# Altium footprint library Selex_PCBLib.PcbLib: 388 footprints (part 3 of 25)
Each footprint in its own frame and in the unit in brackets; x right, y up, seen from the top. Pads: shape width x height; smd on the part's side, far side on the other; paste and mask are expansions set on the pad; w line width, h text height; cw(c..) or ccw(c..) is an arc to the next point about the centre after c.
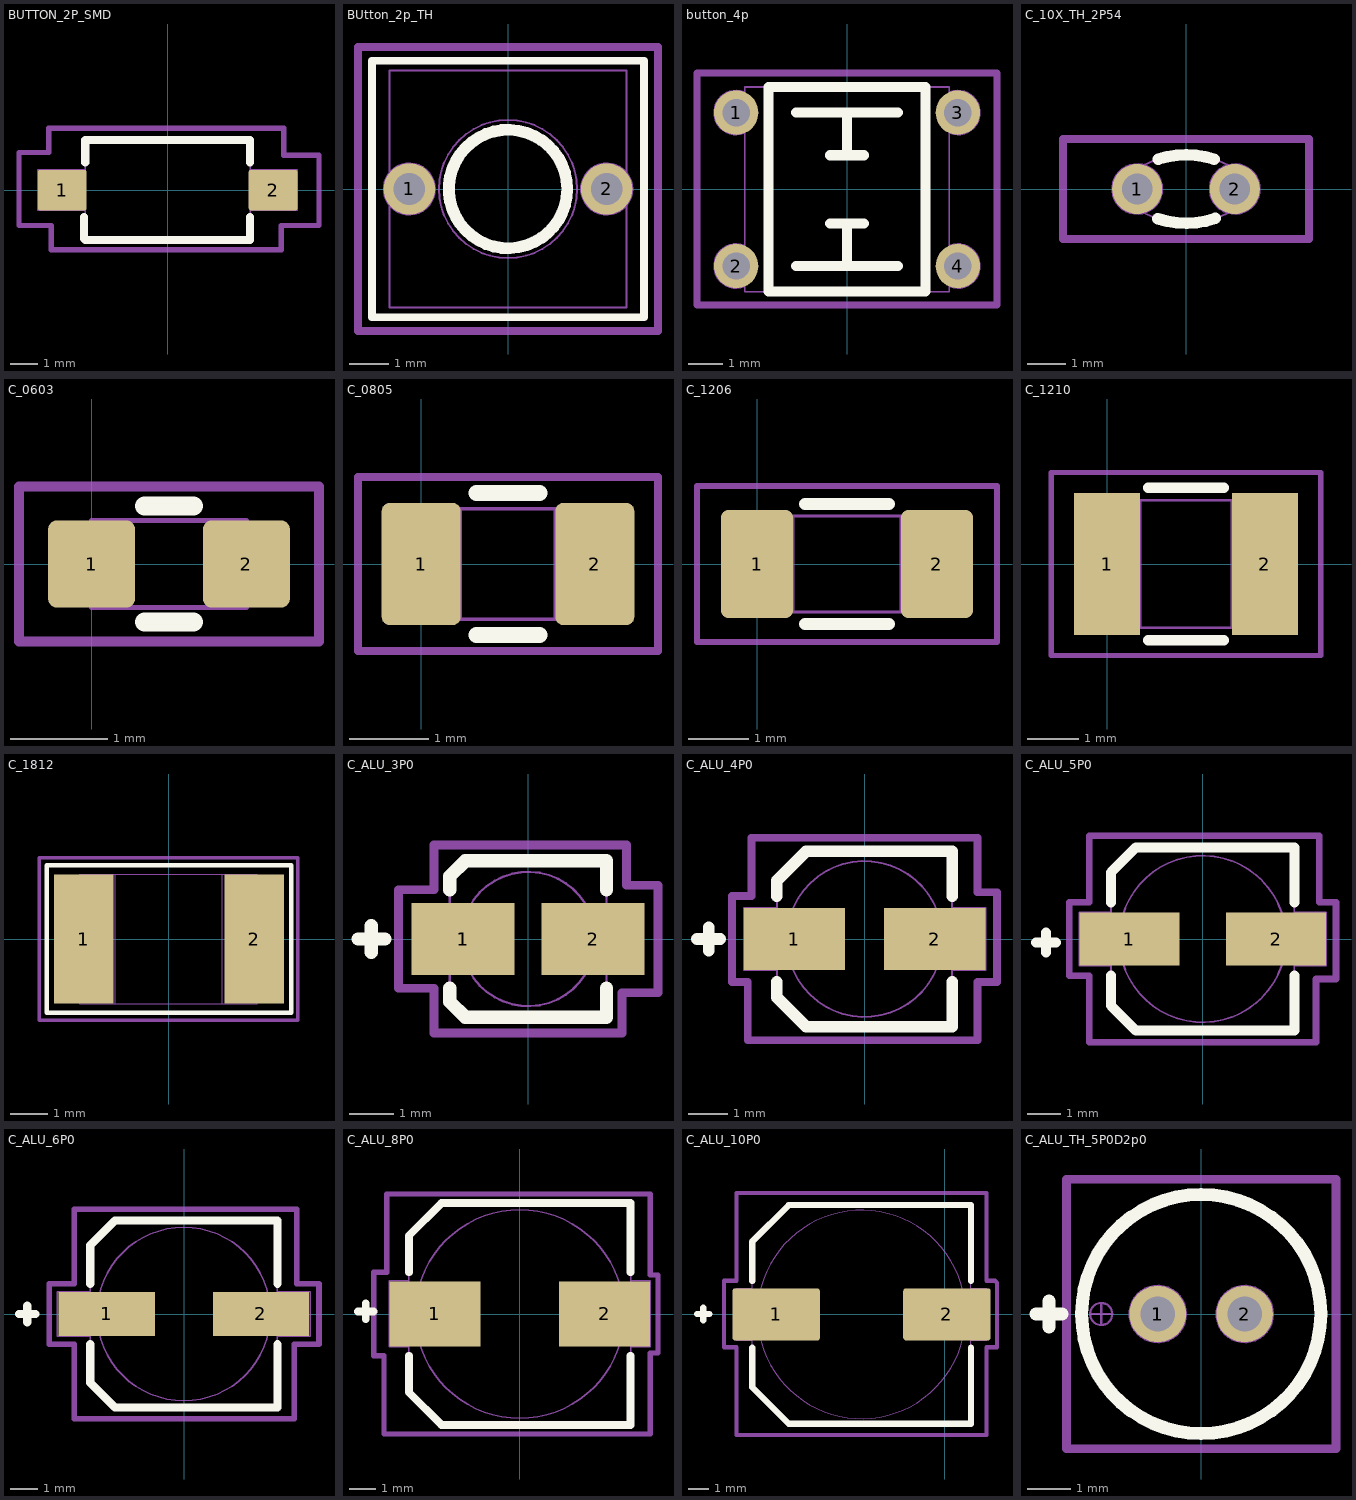
[diagram p2: the footprints below, top view; thin cyan lines are the x and y axes]

## BUTTON_2P_SMD [mm]
pads (2):
  rrect10% 1.8x1.5 smd mask+0.05: 1(-3.9,0.01) 2(3.9,0.01)
Top Overlay:
  lines w0.3: -3.1,-1.79 -3.1,-0.99 ; -3.05,-1.84 3.05,-1.84 3.05,-0.99 ; -3.05,1.035 -3.05,1.86 ; 2.2,1.86 -3.05,1.86 ; 3.05,1.035 3.05,1.86 -3.05,1.86
Mechanical 1:
  lines w0.05: -3.05,-0.74 -4.8,-0.74 -4.8,0.76 -3.05,0.76 ; 3.05,-0.74 4.8,-0.74 4.8,0.76 3.05,0.76 ; -3.05,-1.84 3.05,-1.84 3.05,1.86 -3.05,1.86 -3.05,-1.84
Mechanical 15:
  lines w0.2: -5.5,-1.3 -4.3,-1.3 -4.3,-2.2 4.2,-2.2 4.2,-1.3 5.6,-1.3 5.6,1.3 4.3,1.3 4.3,2.3 -4.4,2.3 -4.4,1.4 -5.5,1.4 -5.5,-1.3
3D body "User Library-KFC-2Pin SMD.step": height 4.2, standoff 0, extent -4.075,-1.665 3.925,1.835

## BUtton_2p_TH [mm]
pads (2):
  round 1.3 hole 0.8 mask+0.1: 1(-2.5,0) 2(2.5,0)
Top Overlay:
  circle w0.3: c0,0 r1.5
  lines w0.2: -3.45,-3.25 -3.45,3.25 3.45,3.25 3.45,-3.25 -3.45,-3.25
Mechanical 1:
  circle w0.05: c0,0 r1.75
  circle w0.05: c2.5,0 r0.65
  circle w0.05: c-2.5,0 r0.65
  lines w0.05: -3,-0.41 -3,-3 3,-3 3,-0.42 ; -3,0.41 -3,3 3,3 3,0.42
Mechanical 15:
  lines w0.2: -3.8,-3.6 3.8,-3.6 3.8,3.6 -1.2,3.6 -3.8,3.6 -3.8,-3.6
3D body "button2pin.step": height 4.2, standoff -4, extent -3,-3 3,3

## button_4p [mm]
pads (4):
  round 1.3 hole 0.8 mask+0.05: 1(-3.25,2.24) 2(-3.25,-2.26) 3(3.25,2.24) 4(3.25,-2.26)
Top Overlay:
  lines w0.3: -1.5,-2.26 1.5,-2.26 ; -1.5,2.24 1.5,2.24 ; -0.5,-1.01 0.5,-1.01 ; -0.5,0.99 0.5,0.99 ; 0,-2.26 0,-1.01 ; 0,0.99 0,2.24 ; -2.3,-3.01 2.3,-3.01 2.3,2.99 -2.3,2.99 -2.3,-3.01
Mechanical 1:
  lines w0.05: -3.017,-2.867 cw(c-3.25,-2.26) -3.017,-1.653 ; -3.017,1.633 cw(c-3.25,2.24) -3.017,2.847 ; 3.017,-2.867 ccw(c3.25,-2.26) 3.017,-1.653 ; 3.017,1.633 ccw(c3.25,2.24) 3.017,2.847 ; -3,-3.01 3,-3.01 3,2.99 -3,2.99 -3,-3.01
Mechanical 15:
  lines w0.2: -4.4,-3.4 4.4,-3.4 4.4,-0.8 4.4,3.4 -4.4,3.4 -4.4,-3.4
3D body "buttona.stp": height 5, standoff -3.5, extent -3.95,-3.11 3.95,3.09

## C_10X_TH_2P54 [mm] "Cap 10x"
pads (2):
  round 1.3 hole 0.8: 1(-1.27,0) 2(1.27,0)
Top Overlay:
  lines w0.2: -0.053,-0.89 0.041,-0.89 ; -0.041,0.89 0.053,0.89
  lines w0.3: -0.732,-0.776 ccw(c0,1.507) 0.759,-0.767 ; -0.723,0.779 cw(c0,-1.507) 0.729,0.777
Mechanical 1:
  circle w0.05: c1.27,0 r0.65
  circle w0.05: c-1.27,0 r0.65
  lines w0.05: -1.09,0.628 cw(c0,-1.507) 1.094,0.626 ; -1.086,-0.63 ccw(c0,1.507) 1.097,-0.625
Mechanical 15:
  lines w0.2: -3.2,-1.3 0,-1.3 3.2,-1.3 3.2,1.3 -3.2,1.3 -3.2,-1.3
3D body "Ceramic Cap 100n.STEP": height 6.42, standoff -1.5, extent -2.917,-0.848 2.921,0.848

## C_0603 [mm] "Capacitor 0603"
pads (2):
  rrect20% 0.9x0.9 smd mask+0.1: 1(0,0) 2(1.6,0)
Top Overlay:
  lines w0.2: 0.55,-0.6 1.05,-0.6 ; 0.55,0.6 1.05,0.6
Top Component Outline:
  lines w0.1: -0.75,-0.8 -0.75,0.8 2.35,0.8 2.35,-0.8 -0.75,-0.8
Top Assembly:
  lines w0.05: 0.4,-0.45 0.4,0.45 ; 1.2,-0.45 1.2,0.45 ; 0,-0.45 0,0.45 1.6,0.45 1.6,-0.45 0,-0.45
3D body "capacitor 0603.step": height 0.81, standoff 0.01, extent 0,-0.45 1.6,0.45

## C_0805 [mm] "Capacitor 0805"
pads (2):
  rrect20% 1x1.55 smd mask+0.1: 1(0,0) 2(2.2,0)
Top Overlay:
  lines w0.2: 0.7,-0.9 1.5,-0.9 ; 0.7,0.9 1.5,0.9
Mechanical 1:
  lines w0.05: 0.49,-0.7 0.49,0.7 ; 1.7,-0.7 1.7,0.675 ; 0,-0.7 2.2,-0.7 2.2,0.7 0,0.7 0,-0.7
Mechanical 15:
  lines w0.1: -0.8,-1.1 -0.8,1.1 3,1.1 3,-1.1 -0.8,-1.1
3D body "CAP0805.step": height 1.35, standoff 0, extent 0,-0.725 2.2,0.725

## C_1206 [mm] "Capacitor 1206"
pads (2):
  rrect20% 1.2x1.8 smd mask+0.1: 1(0,0) 2(3,0)
Top Overlay:
  lines w0.2: 0.8,-1 2.2,-1 ; 0.8,1 2.2,1
Mechanical 1:
  lines w0.05: 0.6,-0.8 0.6,0.8 ; 2.4,-0.8 2.4,0.8 ; -0.1,-0.8 3.1,-0.8 3.1,0.8 -0.1,0.8 -0.1,-0.8
Mechanical 15:
  lines w0.1: -1,-1.3 -1,1.3 4,1.3 4,-1.3 -1,-1.3
3D body "capacitor 1206.step": height 1, standoff 0, extent -0.1,-0.8 3.1,0.8

## C_1210 [mm] "Capacitor 1210"
pads (2):
  rect 1.3x2.8 smd mask+0.1: 1(0,0) 2(3.1,0)
Top Overlay:
  lines w0.2: 0.8,-1.5 2.3,-1.5 ; 0.8,1.5 2.3,1.5
Mechanical 1:
  lines w0.05: 0.65,-1.25 0.65,1.25 ; 2.45,-1.25 2.45,1.25 ; -0.05,-1.25 -0.05,1.25 3.15,1.25 3.15,-1.25 -0.05,-1.25
Mechanical 15:
  lines w0.1: -1.1,-1.8 4.2,-1.8 4.2,1.8 -1.1,1.8 -1.1,-1.8
3D body "CAP1210a.step": height 1.1, standoff 0, extent -0.09,-1.25 3.19,1.25

## C_1812 [mm]
pads (2):
  rect 1.606x3.5 smd: 1(-2.3,0) 2(2.325,0)
Top Overlay:
  lines w0.127: -3.3,-2 -3.3,2 -2.6,2 3.327,2 3.327,-2 1.8,-2 -3.3,-2
Mechanical 1:
  lines w0.025: -2.4,-1.75 -2.4,1.75 ; -2.4,-1.75 -1.45,-1.75 -1.45,1.75 -2.4,1.75 ; -2.4,-1.75 2.4,-1.75 ; -2.4,-1.75 -2.4,1.75 ; -2.4,1.75 2.4,1.75 ; 2.4,-1.75 1.45,-1.75 1.45,1.75 2.4,1.75 ; 2.4,-1.75 2.4,1.75 ; 2.4,-1.75 2.4,1.75
Mechanical 15:
  lines w0.1: -3.5,-2.2 -3.5,2.2 3.5,2.2 3.5,-2.2 -3.5,-2.2
3D body "CAPC480350_180N_KEM.step": height 1.8, standoff 0, extent -2.4,-1.75 2.4,1.75

## C_ALU_3P0 [mm] "Panasonic Aluminum Capacitor 3.0x5.4"
pads (3):
  rect 2.3x1.6 smd mask+0.1: 1(-1.45,0) 1(-1.45,0) 2(1.45,0)
Top Overlay:
  lines w0.3: -3.8,0 -3.2,0 ; -3.5,-0.3 -3.5,0.3 ; -1.75,-1.1 -1.75,-1.4 -1.4,-1.75 1.75,-1.75 1.75,-1.1 ; -1.75,1.1 -1.75,1.4 -1.4,1.75 1.75,1.75 1.75,1.1
Mechanical 1:
  circle w0.05: c0,0 r1.5
  lines w0.05: -1.75,-1.4 -1.75,1.4 -1.4,1.75 1.75,1.75 1.75,-1.75 -1.4,-1.75 -1.75,-1.4
Mechanical 15:
  lines w0.2: -2.9,-1.1 -2.9,1.1 -2.1,1.1 -2.1,2.1 2.2,2.1 2.2,1.2 2.9,1.2 2.9,-1.2 2.1,-1.2 2.1,-2.1 -2.1,-2.1 -2.1,-1.1 -2.9,-1.1

## C_ALU_4P0 [mm] "Panasonic Aluminum Capacitor 4.0 x5.4"
pads (2):
  rect 2.6x1.6 smd mask+0.1: 1(-1.8,0) 2(1.8,0)
Top Overlay:
  lines w0.3: -4.3,0 -3.7,0 ; -4,-0.3 -4,0.3 ; -2.25,-1.1 -2.25,-1.5 -1.5,-2.25 2.25,-2.25 2.25,-1.1 ; -2.25,1.1 -2.25,1.5 -1.5,2.25 2.25,2.25 2.25,1.1
Mechanical 1:
  circle w0.05: c0,0 r2
  lines w0.05: -2.25,-0.8 -3.1,-0.8 -3.1,0.8 -2.25,0.8 ; 2.25,-0.8 3.1,-0.8 3.1,0.8 2.25,0.8 ; -2.25,-1.5 -2.25,1.5 -1.5,2.25 2.25,2.25 2.25,-2.25 -1.5,-2.25 -2.25,-1.5
Mechanical 15:
  lines w0.2: -3.4,-1.1 -3,-1.1 -3,-2.6 2.9,-2.6 2.9,-1.1 3.4,-1.1 3.4,1.2 2.9,1.2 2.9,2.6 -2.9,2.6 -2.9,1.1 -3.4,1.1 -3.4,-1.1
3D body "CAPALUSIZEB.step": height 5.7, standoff 0, extent -2.65,-2.15 2.65,2.15

## C_ALU_5P0 [mm] "Panasonic Aluminum Capacitor 5x5.4"
pads (2):
  rect 3x1.6 smd mask+0.1: 1(-2.2,0) 2(2.2,0)
Top Overlay:
  lines w0.3: -5,-0.1 -4.4,-0.1 ; -4.7,-0.4 -4.7,0.2 ; -2.75,-1.1 -2.75,-2 -2,-2.75 2.75,-2.75 2.75,-1.1 ; -2.75,1.1 -2.75,2 -2,2.75 2.75,2.75 2.75,1.1
Mechanical 1:
  circle w0.05: c0,0 r2.5
  lines w0.05: -2.75,-0.8 -3.7,-0.8 -3.7,0.8 -2.75,0.8 ; 2.75,-0.8 3.7,-0.8 3.7,0.8 2.75,0.8 ; -2.75,-2 -2.75,2 -2,2.75 2.75,2.75 2.75,-2.75 -2,-2.75 -2.75,-2
Mechanical 15:
  lines w0.2: -4,-1.1 -4,1.1 -3.4,1.1 -3.4,3.1 -2,3.1 3.5,3.1 3.5,1.1 4,1.1 4,-1.2 3.4,-1.2 3.4,-3.1 -3.4,-3.1 -3.4,-1.1 -4,-1.1
3D body "CAPALUSIZEC.step": height 5.7, standoff 0, extent -3.15,-2.65 3.15,2.65

## C_ALU_6P0 [mm] "Panasonic Aluminum Capacitor 6.3x5.4"
pads (2):
  rect 3.5x1.6 smd mask+0.1: 1(-2.81,0) 2(2.79,0)
Top Overlay:
  lines w0.3: -6,0 -5.4,0 ; -5.7,-0.3 -5.7,0.3 ; -3.41,-1.1 -3.41,-2.5 -2.51,-3.4 3.39,-3.4 3.39,-1.1 ; -3.41,1.1 -3.41,2.5 -2.51,3.4 3.39,3.4 3.39,1.1
Mechanical 1:
  circle w0.05: c-0.01,0 r3.15
  lines w0.05: -3.41,-0.8 -4.61,-0.8 -4.61,0.8 -3.41,0.8 ; 3.39,-0.8 4.59,-0.8 4.59,0.8 3.39,0.8 ; -3.41,-2.5 -3.41,2.5 -2.51,3.4 3.39,3.4 3.39,-3.4 -2.51,-3.4 -3.41,-2.5
Mechanical 15:
  lines w0.2: -4.9,-1.1 -4,-1.1 -4,-3.8 4,-3.8 4,-1.1 4.9,-1.1 4.9,1.1 4.1,1.1 4.1,3.8 -2.5,3.8 -4,3.8 -4,1.1 -4.9,1.1 -4.9,-1.1
3D body "CAPALUSIZED8.step": height 8, standoff 0, extent -3.81,-3.3 3.79,3.3

## C_ALU_8P0 [mm] "Panasonic Aluminum Capacitor"
pads (2):
  rect 3.5x2.5 smd mask+0.1: 1(-3.25,0) 2(3.25,0)
Top Overlay:
  lines w0.3: -6.2,0.1 -5.6,0.1 ; -5.9,-0.2 -5.9,0.4 ; -4.25,-1.6 -4.25,-3 -3,-4.25 4.25,-4.25 4.25,-1.6 ; -4.25,1.6 -4.25,3 -3,4.25 4.25,4.25 4.25,1.6
Mechanical 1:
  circle w0.05: c0,0 r4
  lines w0.05: -4.25,-1.25 -5,-1.25 -5,1.27 -4.25,1.27 ; 4.25,-1.25 5,-1.25 5,1.27 4.25,1.27 ; -4.25,-3 -4.25,3 -3,4.25 4.25,4.25 4.25,-4.25 -3,-4.25 -4.25,-3
Mechanical 15:
  lines w0.2: -5.6,-1.6 -5.2,-1.6 -5.2,-4.6 5,-4.6 5,-1.5 5.3,-1.5 5.3,1.5 5,1.5 5,4.6 -2.5,4.6 -5.1,4.6 -5.1,1.6 -5.6,1.6 -5.6,-1.6
3D body "CAPALUSIZEF.STEP": height 10.3, standoff -0.2, extent -4.852,-4.25 4.848,4.25

## C_ALU_10P0 [mm] "Panasonic Aluminum Capacitor 10x10.2"
pads (2):
  rrect10% 4.2x2.5 smd mask+0.05: 1(-8.1,-0.02) 2(0.1,-0.02)
Top Overlay:
  lines w0.3: -11.9,0 -11.3,0 ; -11.6,-0.3 -11.6,0.3 ; -9.25,-1.62 -9.25,-3.52 -7.5,-5.27 1.25,-5.27 1.25,-1.62 ; -9.25,1.58 -9.25,3.48 -7.5,5.23 1.25,5.23 1.25,1.58
Mechanical 1:
  circle w0.05: c-4,-0.02 r5
  lines w0.05: -9.25,-1.27 -10.01,-1.27 -10.01,1.24 -9.25,1.24 ; 1.25,-1.27 2,-1.27 2,1.24 1.25,1.24 ; -9.25,-3.52 -9.25,3.48 -7.5,5.23 1.25,5.23 1.25,-5.27 -7.5,-5.27 -9.25,-3.52
Mechanical 15:
  lines w0.2: -10.6,-1.6 -10,-1.6 -10,-5.8 2,-5.8 2,-1.6 2.5,-1.6 2.5,1.5 2.4,1.6 2,1.6 2,5.8 -10,5.8 -10,1.6 -10.6,1.6 -10.6,0 -10.6,-1.6
3D body "CAPALUSIZEG.step": height 10.8, standoff 0, extent -9.66,-5.18 1.64,5.12

## C_ALU_TH_5P0D2p0 [mm] "Use for 0.1/0.22/0.33/0.47/1/2.2/3.3/4.7/10/22 uF Capacitor Through Hole"
pads (3):
  round 1.3 hole 0.8 mask+0.1: 1(-1,0) 1(-1,0) 2(1,0)
Top Overlay:
  circle w0.3: c0,0 r2.75
  lines w0.3: -3.8,0 -3.2,0 ; -3.5,-0.3 -3.5,0.3
Mechanical 1:
  circle w0.05: c-2.3,0 r0.254
  circle w0.05: c-1,0 r0.65
  circle w0.05: c1,0 r0.65
  circle w0.05: c0,0 r2.75
  lines w0.05: -2.554,0 -2.046,0 ; -2.3,-0.254 -2.3,0.254
Mechanical 15:
  lines w0.2: -3.1,-3.1 3.1,-3.1 3.1,3.1 -3.1,3.1 -3.1,-3.1
3D body "CAP5x11.step": height 11.03, standoff -3.77, extent -2.525,-2.525 2.525,2.525